# Altium footprint library DipComponent.PcbLib: 303 footprints (part 12 of 19)
Each footprint in its own frame and in the unit in brackets; x right, y up, seen from the top. Pads: shape width x height; smd on the part's side, far side on the other; paste and mask are expansions set on the pad; w line width, h text height; cw(c..) or ccw(c..) is an arc to the next point about the centre after c.
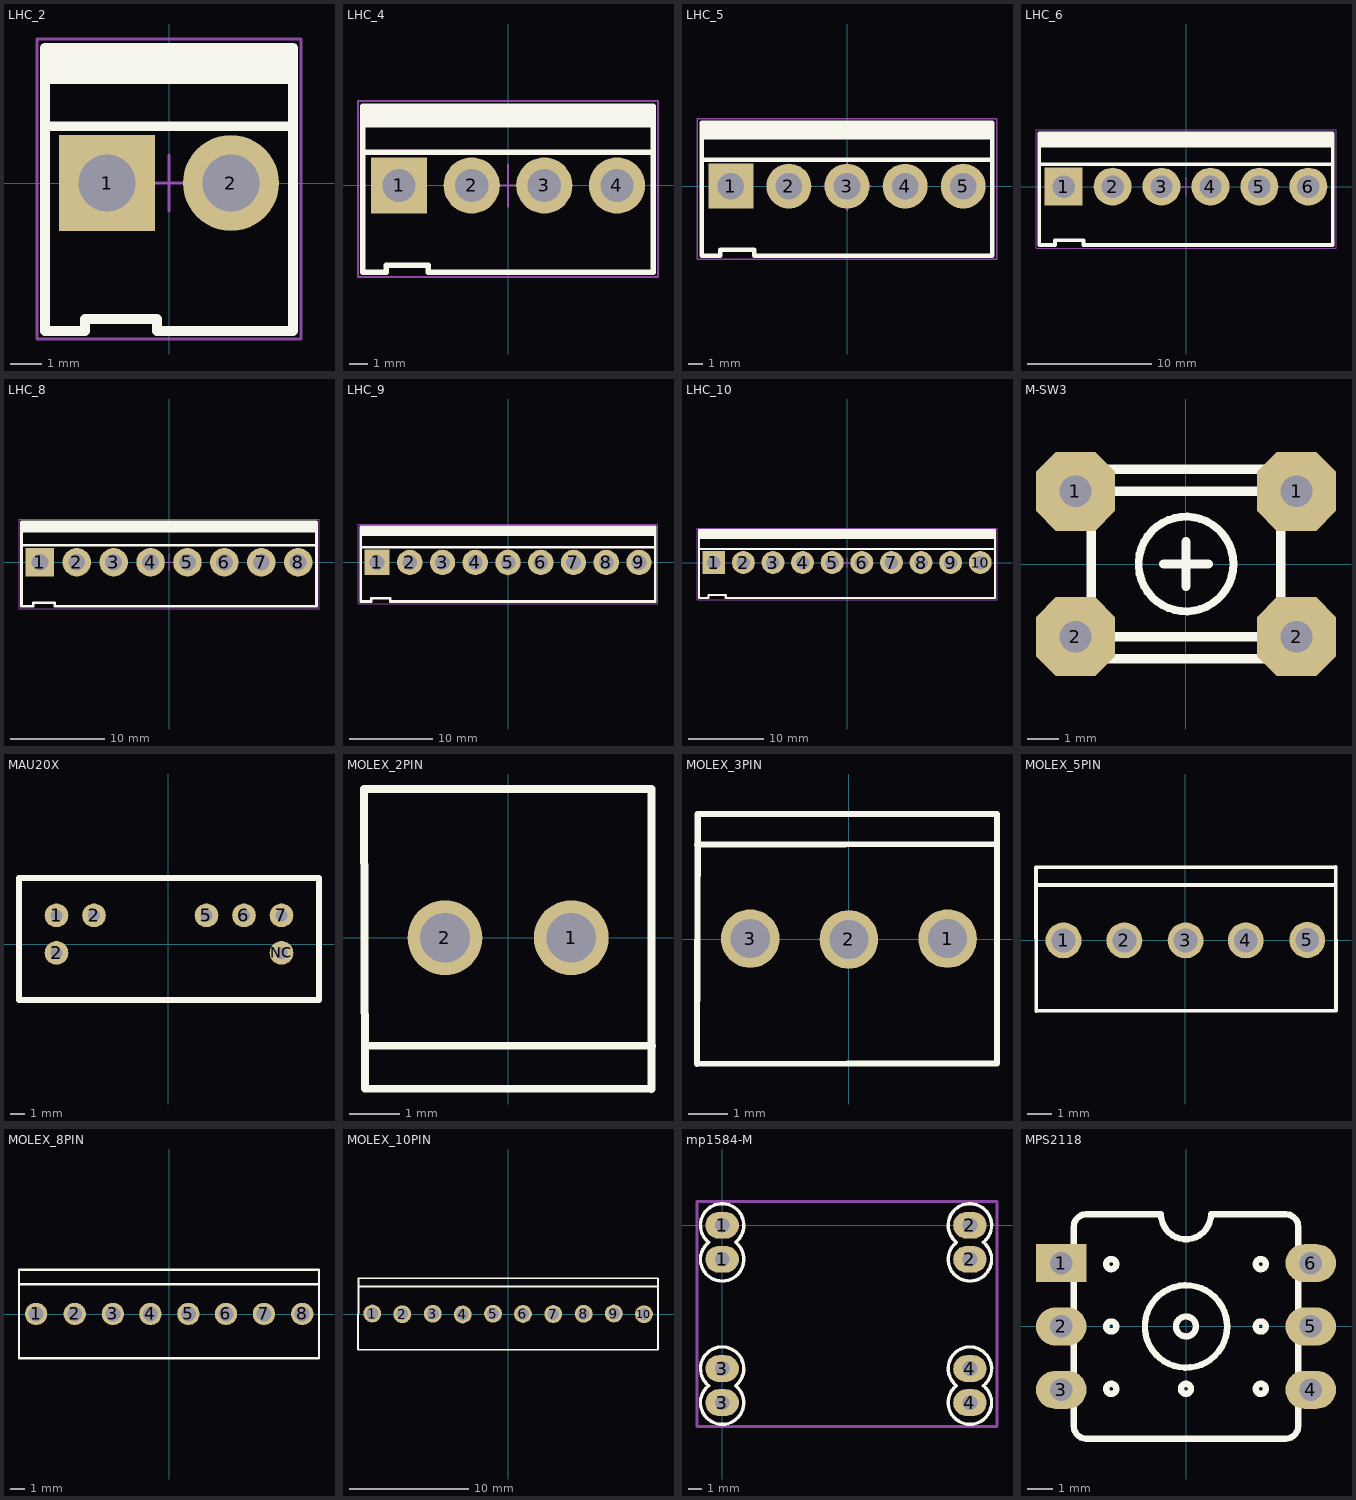
[diagram p11: the footprints below, top view; thin cyan lines are the x and y axes]

## LHC_2 [mil] "Connector; Power; 2 Position,3.96mm Pitch"
height 370.08
pads (2):
  rect 120x120 hole 70.87: 1(-77.5,0)
  round 120 hole 70.87: 2(77.5,0)
Top Overlay:
  rectangle: -155,129.92 155,169.29
  lines w12: -155,70.96 155,70.96 ; -155,-185.04 -155,129.92 ; -155,-185.04 -155,129.92 ; -155,-185.04 -105,-185.04 -105,-170 -15,-170 -15,-185.04 155,-185.04 155,129.92 ; -155,129.92 -155,169.29 155,169.29 155,129.92 ; -155,129.92 155,129.92
Mechanical 13:
  lines w3.94: -155,70.96 155,70.96 ; -155,-185.04 -105,-185.04 -105,-170 -15,-170 -15,-185.04 155,-185.04 155,129.92 ; -155,-185.04 -155,129.92 ; -155,-185.04 -155,129.92 ; -155,129.92 155,129.92 ; -155,129.92 -155,169.29 155,169.29 155,129.92 ; -105.06,-27.56 -49.94,-27.56 -49.94,27.56 -105.06,27.56 -105.06,-27.56 ; 49.94,-27.56 49.94,27.56 105.06,27.56 105.06,-27.56 49.94,-27.56
Mechanical 15:
  lines w3.94: -35,0 0,0 ; 0,-35 0,0 ; 0,35 0,0 ; 35,0 0,0 ; -165,-195 165,-195 165,180 -165,180 -165,-195
3D body: height 429.92, standoff -145.67, extent -105.04,-27.54 -49.96,27.54
3D body: height 429.92, standoff -145.67, extent 49.96,-27.54 105.04,27.54
3D body: height 129.92, standoff 0, extent -154.98,-185.02 154.98,70.96
3D body: height 370.08, standoff 314.96, extent -154.98,129.94 154.98,169.27
3D body: height 370.08, standoff 0, extent -155,70.96 154.96,129.92

## LHC_4 [mil] "Connector; Power; 4 Position,3.96mm Pitch"
height 370.08
pads (4):
  rect 120x120 hole 70.87: 1(-232.5,0)
  round 120 hole 70.87: 2(-77.5,0) 3(77.5,0) 4(232.5,0)
Top Overlay:
  rectangle: -310,129.92 310,169.29
  lines w12: -310,70.96 310,70.96 ; -310,129.92 0,129.92 310,129.92 ; -310,129.92 -310,-185.04 -260,-185.04 -260,-170 -170,-170 -170,-185.04 310,-185.04 310,129.92 ; -310,129.92 -310,169.29 310,169.29 310,129.92
Mechanical 13:
  lines w3.94: -310,70.96 310,70.96 ; -310,129.92 -310,169.29 310,169.29 310,129.92 ; -310,129.92 -310,-185.04 -260,-185.04 -260,-170 -170,-170 -170,-185.04 310,-185.04 310,129.92 ; -310,129.92 0,129.92 310,129.92 ; -260.06,-27.56 -260.06,27.56 -204.94,27.56 -204.94,-27.56 -260.06,-27.56 ; -105.06,-27.56 -49.94,-27.56 -49.94,27.56 -105.06,27.56 -105.06,-27.56 ; 49.94,-27.56 49.94,27.56 105.06,27.56 105.06,-27.56 49.94,-27.56 ; 204.94,-27.56 260.06,-27.56 260.06,27.56 204.94,27.56 204.94,-27.56
Mechanical 15:
  lines w3.94: -45,0 0,0 ; 0,-45 0,0 ; 0,45 0,0 ; 45,0 0,0 ; -320,-195 -320,180 320,180 320,-195 -320,-195
3D body: height 429.92, standoff -145.67, extent -105.04,-27.54 -49.96,27.54
3D body: height 429.92, standoff -145.67, extent -260.04,-27.54 -204.96,27.54
3D body: height 429.92, standoff -145.67, extent 204.96,-27.54 260.04,27.54
3D body: height 429.92, standoff -145.67, extent 49.96,-27.54 105.04,27.54
3D body: height 370.08, standoff 0, extent -309.98,70.98 309.98,129.9
3D body: height 370.08, standoff 330.71, extent -309.98,129.94 309.98,169.27
3D body: height 129.92, standoff 0, extent -309.98,-185.02 309.98,70.94

## LHC_5 [mil] "Connector; Power; 5 Position,3.96mm Pitch"
pads (5):
  rect 120x120 hole 70.87: 1(-310,0)
  round 120 hole 70.87: 2(-155,0) 3(0,0) 4(155,0) 5(310,0)
Top Overlay:
  rectangle: -387.5,129.92 387.5,169.29
  lines w12: -387.5,70.96 387.5,70.96 ; 387.5,129.92 -387.5,129.92 ; -387.5,129.92 -387.5,169.29 387.5,169.29 387.5,-185.04 -247.5,-185.04 -247.5,-170 -337.5,-170 -337.5,-185.04 -387.5,-185.04 -387.5,129.92
Mechanical 13:
  lines w3.94: -387.5,70.96 387.5,70.96 ; 387.5,129.92 -387.5,129.92 ; -387.5,129.92 -387.5,-185.04 -337.5,-185.04 -337.5,-170 -247.5,-170 -247.5,-185.04 387.5,-185.04 387.5,169.29 -387.5,169.29 -387.5,129.92 ; -337.56,-27.56 -282.44,-27.56 -282.44,27.56 -337.56,27.56 -337.56,-27.56 ; -182.56,-27.56 -182.56,27.56 -127.44,27.56 -127.44,-27.56 -182.56,-27.56 ; -27.56,-27.56 27.56,-27.56 27.56,27.56 -27.56,27.56 -27.56,-27.56 ; 127.44,-27.56 127.44,27.56 182.56,27.56 182.56,-27.56 127.44,-27.56 ; 282.44,-27.56 337.56,-27.56 337.56,27.56 282.44,27.56 282.44,-27.56
Mechanical 15:
  lines w3.94: -65,0 0,0 ; 0,-65 0,0 ; 0,65 0,0 ; 65,0 0,0 ; -400,-195 400,-195 400,180 -400,180 -400,-195
3D body: height 370.08, standoff 0, extent -387.48,70.98 387.48,129.9
3D body: height 129.92, standoff 0, extent -387.48,-185.02 387.48,70.94
3D body: height 370.08, standoff 330.71, extent -387.48,129.94 387.48,169.27
3D body: height 429.92, standoff -145.67, extent -337.54,-27.54 -282.46,27.54
3D body: height 429.92, standoff -145.67, extent -182.54,-27.54 -127.46,27.54
3D body: height 429.92, standoff -145.67, extent -27.54,-27.54 27.54,27.54
3D body: height 429.92, standoff -145.67, extent 127.46,-27.54 182.54,27.54
3D body: height 429.92, standoff -145.67, extent 282.46,-27.54 337.54,27.54

## LHC_6 [mil] "Connector; Power; 6 Position,3.96mm Pitch"
height 370.08
pads (6):
  rect 120x120 hole 70.87: 1(-387.5,0)
  round 120 hole 70.87: 2(-232.5,0) 3(-77.5,0) 4(77.5,0) 5(232.5,0) 6(387.5,0)
Top Overlay:
  rectangle: -465,129.92 465,169.29
  lines w12: -465,70.96 465,70.96 ; -155,169.29 -465,169.29 ; 465,129.92 -465,129.92 ; -465,-185.04 -415,-185.04 -415,-170 -325,-170 ; -465,-185.04 -465,129.92 ; -465,-185.04 -465,129.92 ; -465,129.92 -465,169.29 ; -465,169.29 465,169.29 465,-185.04 -325,-185.04 ; -325,-185.04 -325,-170 ; -325,-185.04 -325,-170
Mechanical 13:
  lines w3.94: -465,70 465,70 ; -465,129.92 465,129.92 ; -465,-185.04 -415,-185.04 -415,-170 -325,-170 -325,-185.04 465,-185.04 465,169.29 -465,169.29 -465,-185.04 ; -415.06,-27.56 -415.06,27.56 -359.94,27.56 -359.94,-27.56 -415.06,-27.56 ; -260.06,-27.56 -204.94,-27.56 -204.94,27.56 -260.06,27.56 -260.06,-27.56 ; -105.06,-27.56 -105.06,27.56 -49.94,27.56 -49.94,-27.56 -105.06,-27.56 ; 49.94,-27.56 105.06,-27.56 105.06,27.56 49.94,27.56 49.94,-27.56 ; 204.94,-27.56 204.94,27.56 260.06,27.56 260.06,-27.56 204.94,-27.56 ; 359.94,-27.56 415.06,-27.56 415.06,27.56 359.94,27.56 359.94,-27.56
Mechanical 15:
  lines w3.94: -30,0 0,0 ; 0,-30 0,0 ; 0,30 0,0 ; 30,0 0,0 ; -475,-195 475,-195 475,180 -475,180 -475,-195
3D body: height 429.92, standoff -145.67, extent -260.04,-27.54 -204.96,27.54
3D body: height 429.92, standoff -145.67, extent -415.04,-27.54 -359.96,27.54
3D body: height 429.92, standoff -145.67, extent 49.96,-27.54 105.04,27.54
3D body: height 429.92, standoff -145.67, extent -105.04,-27.54 -49.96,27.54
3D body: height 429.92, standoff -145.67, extent 359.96,-27.54 415.04,27.54
3D body: height 429.92, standoff -145.67, extent 204.96,-27.54 260.04,27.54
3D body: height 370.08, standoff 330.71, extent -464.98,129.94 464.98,169.27
3D body: height 370.08, standoff 0, extent -464.98,70.02 464.98,129.9
3D body: height 129.92, standoff 0, extent -464.98,-185.02 464.98,69.98

## LHC_8 [mil] "Connector; Power; 8 Position,3.96mm Pitch"
height 370.08
pads (8):
  rect 120x120 hole 70.87: 1(-542.5,0)
  round 120 hole 70.87: 2(-387.5,0) 3(-232.5,0) 4(-77.5,0) 5(77.5,0) 6(232.5,0) 7(387.5,0) 8(542.5,0)
Top Overlay:
  rectangle: -620,129.92 620,169.29
  lines w12: -620,70.96 -310,70.96 ; -620,71 620,71 ; 620,129.92 -620,129.92 ; -620,129.92 -620,169.29 620,169.29 620,-185.04 -480,-185.04 -480,-170 -570,-170 -570,-185.04 -620,-185.04 -620,129.92
Mechanical 13:
  lines w3.94: -620,70.96 -310,70.96 ; -620,71 620,71 ; 620,129.92 -620,129.92 ; -620,129.92 -620,-185.04 -570,-185.04 -570,-170 -480,-170 -480,-185.04 620,-185.04 620,169.29 -620,169.29 -620,129.92 ; -570.06,-27.56 -514.94,-27.56 -514.94,27.56 -570.06,27.56 -570.06,-27.56 ; -415.06,-27.56 -415.06,27.56 -359.94,27.56 -359.94,-27.56 -415.06,-27.56 ; -260.06,-27.56 -204.94,-27.56 -204.94,27.56 -260.06,27.56 -260.06,-27.56 ; -105.06,-27.56 -105.06,27.56 -49.94,27.56 -49.94,-27.56 -105.06,-27.56 ; 49.94,-27.56 105.06,-27.56 105.06,27.56 49.94,27.56 49.94,-27.56 ; 204.94,-27.56 204.94,27.56 260.06,27.56 260.06,-27.56 204.94,-27.56 ; 359.94,-27.56 415.06,-27.56 415.06,27.56 359.94,27.56 359.94,-27.56 ; 514.94,-27.56 514.94,27.56 570.06,27.56 570.06,-27.56 514.94,-27.56
Mechanical 15:
  lines w3.94: -35,0 0,0 ; 0,-35 0,0 ; 0,35 0,0 ; 35,0 0,0 ; -630,-195 -630,180 630,180 630,-195 -630,-195
3D body: height 429.92, standoff -145.67, extent 359.96,-27.54 415.04,27.54
3D body: height 429.92, standoff -145.67, extent 514.96,-27.54 570.04,27.54
3D body: height 429.92, standoff -145.67, extent 49.96,-27.54 105.04,27.54
3D body: height 429.92, standoff -145.67, extent 204.96,-27.54 260.04,27.54
3D body: height 429.92, standoff -145.67, extent -260.04,-27.54 -204.96,27.54
3D body: height 429.92, standoff -145.67, extent -105.04,-27.54 -49.96,27.54
3D body: height 429.92, standoff -145.67, extent -570.04,-27.54 -514.96,27.54
3D body: height 429.92, standoff -145.67, extent -415.04,-27.54 -359.96,27.54
3D body: height 370.08, standoff 330.71, extent -619.98,129.94 619.98,169.27
3D body: height 370.08, standoff 0, extent -619.98,71.02 619.98,129.9
3D body: height 129.92, standoff 0, extent -619.98,-185.02 619.98,70.98

## LHC_9 [mil] "Connector; Power; 9 Position,3.96mm Pitch"
height 370.08
pads (9):
  rect 120x120 hole 70.87: 1(-620,0)
  round 120 hole 70.87: 2(-465,0) 3(-310,0) 4(-155,0) 5(0,0) 6(155,0) 7(310,0) 8(465,0) 9(620,0)
Top Overlay:
  rectangle: -697.5,128 697.5,167.37
  lines w12: -697.5,71 697.5,71 ; 697.5,129.92 -697.5,129.92 ; -697.5,129.92 -697.5,-185.04 -647.5,-185.04 -647.5,-170 ; -697.5,129.92 -697.5,169.29 697.5,169.29 697.5,-185.04 -557.5,-185.04 -557.5,-170 ; -647.5,-170 -557.5,-170 ; -647.5,-170 -557.5,-170
Mechanical 13:
  lines w3.94: -697.5,71 697.5,71 ; 697.5,129.92 -697.5,129.92 ; -697.5,129.92 -697.5,169.29 697.5,169.29 697.5,-185.04 -557.5,-185.04 -557.5,-170 ; -697.5,129.92 -697.5,-185.04 -647.5,-185.04 -647.5,-170 ; -647.5,-170 -557.5,-170 ; -647.5,-170 -557.5,-170 ; -647.56,-27.56 -647.56,27.56 -592.44,27.56 -592.44,-27.56 -647.56,-27.56 ; -492.56,-27.56 -437.44,-27.56 -437.44,27.56 -492.56,27.56 -492.56,-27.56 ; -337.56,-27.56 -337.56,27.56 -282.44,27.56 -282.44,-27.56 -337.56,-27.56 ; -182.56,-27.56 -182.56,27.56 -127.44,27.56 -127.44,-27.56 -182.56,-27.56 ; -27.56,-27.56 27.56,-27.56 27.56,27.56 -27.56,27.56 -27.56,-27.56 ; 127.44,-27.56 127.44,27.56 182.56,27.56 182.56,-27.56 127.44,-27.56 ; 282.44,-27.56 282.44,27.56 337.56,27.56 337.56,-27.56 282.44,-27.56 ; 437.44,-27.56 492.56,-27.56 492.56,27.56 437.44,27.56 437.44,-27.56 ; 592.44,-27.56 592.44,27.56 647.56,27.56 647.56,-27.56 592.44,-27.56
Mechanical 15:
  lines w3.94: -65,0 0,0 ; 0,-65 0,0 ; 0,65 0,0 ; 65,0 0,0 ; -710,-195 710,-195 710,180 -710,180 -710,-195
3D body: height 429.92, standoff -145.67, extent 437.46,-27.54 492.54,27.54
3D body: height 429.92, standoff -145.67, extent 282.44,-27.56 337.52,27.52
3D body: height 429.92, standoff -145.67, extent 592.46,-27.54 647.54,27.54
3D body: height 429.92, standoff -145.67, extent -27.54,-27.54 27.54,27.54
3D body: height 429.92, standoff -145.67, extent -182.56,-27.56 -127.48,27.52
3D body: height 429.92, standoff -145.67, extent 127.46,-27.54 182.54,27.54
3D body: height 429.92, standoff -145.67, extent -492.54,-27.54 -437.46,27.54
3D body: height 429.92, standoff -145.67, extent -647.56,-27.56 -592.48,27.52
3D body: height 429.92, standoff -145.67, extent -337.54,-27.54 -282.46,27.54
3D body: height 370.08, standoff 330.71, extent -697.48,129.94 697.48,169.27
3D body: height 370.08, standoff 0, extent -697.48,71.02 697.48,129.9
3D body: height 129.92, standoff 0, extent -697.48,-185.02 697.48,70.98

## LHC_10 [mil] "Connector; Power; 10 Position,3.96mm Pitch"
height 370.08
pads (10):
  rect 120x120 hole 70.87: 1(-697.5,0)
  round 120 hole 70.87: 2(-542.5,0) 3(-387.5,0) 4(-232.5,0) 5(-77.5,0) 6(77.5,0) 7(232.5,0) 8(387.5,0) 9(542.5,0) 10(697.5,0)
Top Overlay:
  rectangle: -775,129.92 775,169.29
  lines w12: -775,70.96 0,70.96 ; -775,71 775,71 ; 775,129.92 -775,129.92 ; -775,129.92 -775,169.29 775,169.29 775,-185.04 -635,-185.04 -635,-170 -725,-170 -725,-185.04 -775,-185.04 -775,129.92
Mechanical 13:
  lines w3.94: -775,70.96 0,70.96 ; -775,71 775,71 ; 775,129.92 -775,129.92 ; -775,129.92 -775,-185.04 -725,-185.04 -725,-170 -635,-170 -635,-185.04 775,-185.04 775,169.29 -775,169.29 -775,129.92 ; -725.06,-27.56 -725.06,27.56 -669.94,27.56 -669.94,-27.56 -725.06,-27.56 ; -570.06,-27.56 -514.94,-27.56 -514.94,27.56 -570.06,27.56 -570.06,-27.56 ; -415.06,-27.56 -415.06,27.56 -359.94,27.56 -359.94,-27.56 -415.06,-27.56 ; -260.06,-27.56 -204.94,-27.56 -204.94,27.56 -260.06,27.56 -260.06,-27.56 ; -105.06,-27.56 -105.06,27.56 -49.94,27.56 -49.94,-27.56 -105.06,-27.56 ; 49.94,-27.56 49.94,27.56 105.06,27.56 105.06,-27.56 49.94,-27.56 ; 204.94,-27.56 260.06,-27.56 260.06,27.56 204.94,27.56 204.94,-27.56 ; 359.94,-27.56 359.94,27.56 415.06,27.56 415.06,-27.56 359.94,-27.56 ; 514.94,-27.56 570.06,-27.56 570.06,27.56 514.94,27.56 514.94,-27.56 ; 669.94,-27.56 669.94,27.56 725.06,27.56 725.06,-27.56 669.94,-27.56
Mechanical 15:
  lines w3.94: -25,0 0,0 ; 0,-25 0,0 ; 0,25 0,0 ; 25,0 0,0 ; -785,-195 785,-195 785,180 -785,180 -785,-195
3D body: height 429.92, standoff -145.67, extent 669.96,-27.54 725.04,27.54
3D body: height 429.92, standoff -145.67, extent 514.96,-27.54 570.04,27.54
3D body: height 429.92, standoff -145.67, extent 359.96,-27.54 415.04,27.54
3D body: height 429.92, standoff -145.67, extent 204.96,-27.54 260.04,27.54
3D body: height 429.92, standoff -145.67, extent 49.96,-27.54 105.04,27.54
3D body: height 429.92, standoff -145.67, extent -105.04,-27.54 -49.96,27.54
3D body: height 429.92, standoff -145.67, extent -260.04,-27.54 -204.96,27.54
3D body: height 429.92, standoff -145.67, extent -415.04,-27.54 -359.96,27.54
3D body: height 429.92, standoff -145.67, extent -570.04,-27.54 -514.96,27.54
3D body: height 429.92, standoff -145.67, extent -725.04,-27.54 -669.96,27.54
3D body: height 370.08, standoff 330.71, extent -774.98,129.94 774.98,169.27
3D body: height 370.08, standoff 0, extent -774.98,71.02 774.98,129.9
3D body: height 129.92, standoff 0, extent -774.98,-185.02 774.98,70.98

## M-SW3 [mm]
pads (4):
  oct 2.5x2.5 hole 1 unplated: 1(-3.5,2.3) 1(3.5,2.3) 2(-3.5,-2.3) 2(3.5,-2.3)
Top Overlay:
  circle w0.25: c0,0 r1.5
  lines w0.3: -3.525,-2.3 3.5,-2.3 ; -3.525,2.3 3.5,2.3 ; -0.7,0 0.7,0 ; 0,-0.7 0,0.7 ; -3,-3 3,-3 3,3 -3,3 -3,-3
3D body "User Library-KFC-A06-HA-4_3.STEP": height 4.3, standoff 0, extent -4.424,-2.946 4.576,3.054

## MAU20X [mm]
pads (7):
  round 1.6 hole 0.8: 1(-7.57,1.959) 2(-7.57,-0.581) 2(-5.03,1.959) 5(2.59,1.959) 6(5.13,1.959) 7(7.67,1.959) NC(7.67,-0.581)
Top Overlay:
  lines w0.4: -10.11,-3.781 -10.11,4.499 10.21,4.499 10.21,-3.781 -10.11,-3.781
3D body "User Library-TMV0505EN.STEP": height 10.2, standoff -3.2, extent -9.852,-3.659 9.648,3.891

## MOLEX_2PIN [mm]
pads (2):
  round 1.5 hole 1: 1(1.265,0) 2(-1.265,0)
Top Overlay:
  lines w0.16: -2.86,-2.16 2.88,-2.17 ; -2.885,2.98 -2.865,-3.02 2.875,-3.03 2.875,2.98 -2.885,2.98
3D body "User Library-Molex 2 pines.STEP": height 3.2, standoff -11.5, extent -2.875,-3.02 2.875,2.98

## MOLEX_3PIN [mm]
pads (3):
  round 1.5 hole 1: 1(2.525,0.01) 2(0,-0.01) 3(-2.525,0.01)
Top Overlay:
  lines w0.16: -3.88,2.41 3.76,2.43 ; -3.887,-3.198 3.79,-3.178 3.79,3.2 -3.867,3.2 -3.887,-3.198
3D body "SW3dPS-Molex - 3-Pin Header with Lock (0.100in pitch).STEP": height 10.69, standoff -3.53, extent -3.835,-3.15 3.785,3.2

## MOLEX_5PIN [mm]
pads (5):
  round 1.5 hole 1: 1(-5.09,-0.01) 2(-2.55,-0.01) 3(0.01,-0.01) 4(2.52,-0.01) 5(5.09,0.01)
Top Overlay:
  lines w0.16: -6.159,2.31 6.27,2.31 ; -6.24,3.04 -6.23,-2.96 6.29,-2.95 6.28,3.06 -6.24,3.04
3D body "User Library-Molex 5 pines.STEP": height 11.5, standoff -3.2, extent -6.24,-2.95 6.28,3.05

## MOLEX_8PIN [mm]
pads (8):
  round 1.5 hole 1: 1(-8.94,0.025) 2(-6.34,0.025) 3(-3.78,0.025) 4(-1.26,0.025) 5(1.29,0.025) 6(3.82,0.025) 7(6.37,0.025) 8(8.94,0.025)
Top Overlay:
  lines w0.16: -10.09,2.03 10.07,2.03 ; -10.09,-2.96 10.07,-2.96 10.07,3 -10.09,3 -10.09,-2.96
3D body "User Library-Molex 8 pines.STEP": height 11.5, standoff -3.2, extent -10.04,-2.995 10.08,3.005

## MOLEX_10PIN [mm]
pads (10):
  round 1.5 hole 1: 1(-11.425,0.035) 2(-8.905,-0.015) 3(-6.335,0.025) 4(-3.825,-0.035) 5(-1.265,0.025) 6(1.245,0.005) 7(3.795,-0.005) 8(6.355,0.015) 9(8.895,0.035) 10(11.425,-0.015)
Top Overlay:
  lines w0.16: -12.55,2.3 12.59,2.3 ; -12.63,-3.01 12.61,-3.01 12.6,3 -12.6,3.01 -12.63,-3.01
3D body "User Library-Molex 10 pines.STEP": height 11.5, standoff -3.2, extent -12.615,-3.005 12.605,2.995

## mp1584-M [mm] "module"
pads (8):
  oval 2.5x2 hole 1.1: 1(0,-2.54) 1(0,0) 2(18.5,-2.54) 2(18.5,0) 3(0,-13.24) 3(0,-10.7) 4(18.5,-13.24) 4(18.5,-10.7)
Top Overlay:
  lines w0.254: -1.017,-11.982 ccw(c0,-13.24) 1.008,-11.974 ; -1.017,-1.282 ccw(c0,-2.54) 1.008,-1.274 ; -1.006,-11.967 cw(c0,-10.7) 1.004,-11.969 ; -1.006,-1.267 cw(c0,0) 1.004,-1.269 ; 17.483,-11.982 ccw(c18.5,-13.24) 19.508,-11.974 ; 17.483,-1.282 ccw(c18.5,-2.54) 19.508,-1.274 ; 17.494,-11.967 cw(c18.5,-10.7) 19.504,-11.969 ; 17.494,-1.267 cw(c18.5,0) 19.504,-1.269
Mechanical 15:
  lines w0.254: -1.877,-15.022 20.523,-15.022 20.523,1.778 -1.877,1.778 -1.877,-15.022

## MPS2118 [mil] "presser Sensor"
pads (6):
  rect 80x60 hole 35.43: 1(-196.85,100)
  oval 80x60 hole 35.43: 2(-196.85,0) 3(-196.85,-100) 4(196.85,-100) 5(196.85,0) 6(196.85,100)
Top Overlay:
  circle w10: c118.11,98.43 r7.97
  circle w10: c-118.11,98.43 r7.97
  circle w10: c-118.11,-98.43 r7.97
  circle w10: c-118.11,0 r7.97
  circle w10: c0,-98.43 r7.97
  circle w10: c118.11,-98.43 r7.97
  circle w10: c118.11,0 r7.97
  circle w10: c0,0 r15.75
  circle w10: c0,0 r64.96
  lines w10: -177.17,-157.48 ccw(c-157.48,-157.48) -157.48,-177.17 157.48,-177.17 ccw(c157.48,-157.48) 177.17,-157.48 177.17,157.48 ccw(c157.48,157.48) 157.48,177.17 39.37,177.17 cw(c0,177.17) -39.37,177.17 -157.48,177.17 ccw(c-157.48,157.48) -177.17,157.48 -177.17,-157.48
3D body: height 123.35, standoff 1.29, extent -177.17,-177.17 177.17,177.17
3D body: height 359.57, standoff 123.35, extent -64.96,-64.96 64.96,64.96